# Altium footprint library Connectors.PcbLib: 131 footprints (part 1 of 9)
Each footprint in its own frame and in the unit in brackets; x right, y up, seen from the top. Pads: shape width x height; smd on the part's side, far side on the other; paste and mask are expansions set on the pad; w line width, h text height; cw(c..) or ccw(c..) is an arc to the next point about the centre after c.
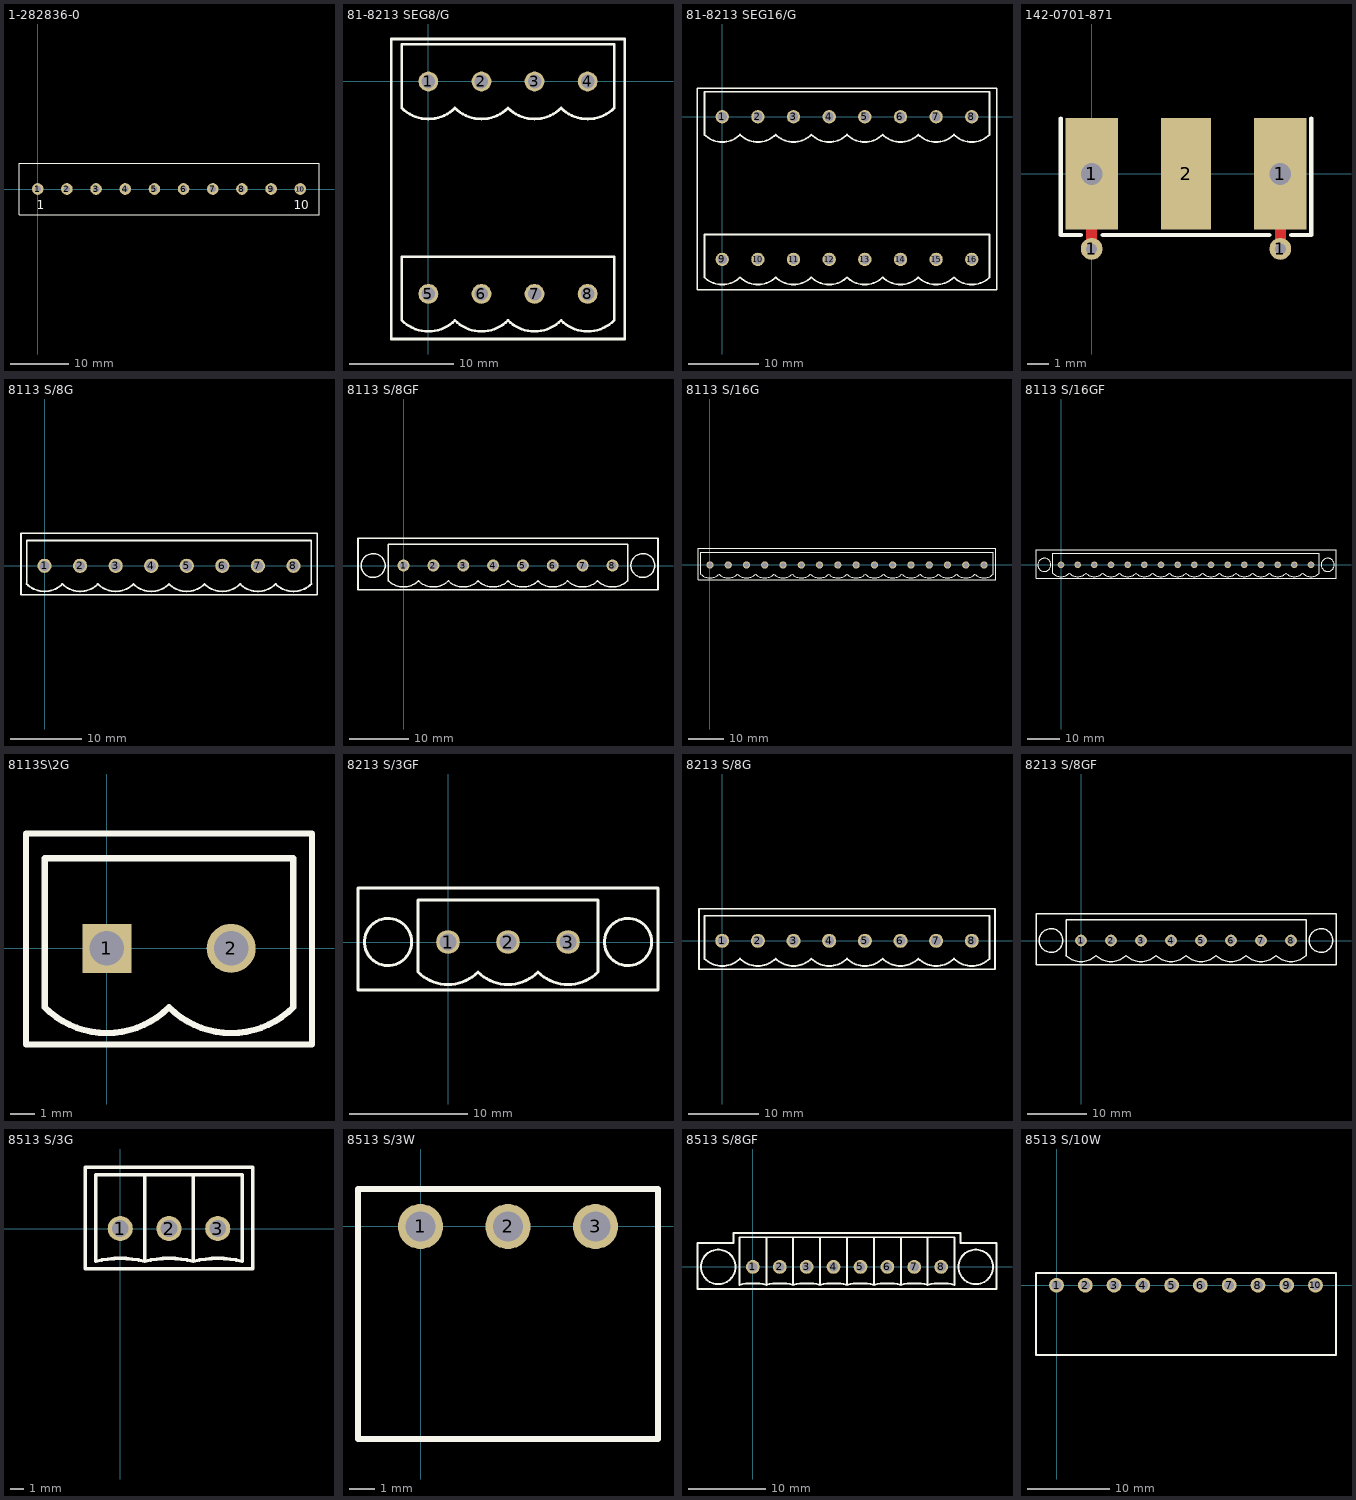
[diagram p0: the footprints below, top view; thin cyan lines are the x and y axes]

## 1-282836-0 [mm]
pads (10):
  round 2 hole 1.1: 1(0,0) 2(5,0) 3(10,0) 4(15,0) 5(20,0) 6(25,0) 7(30,0) 8(35,0) 9(40,0) 10(45,0)
Top Overlay:
  lines w0.2: -3.2,-4.4 -3.2,4.4 48.2,4.4 48.2,-4.4 -3.2,-4.4
  text "1" at -0.2,-3.5 h1.52
  text "10" at 43.9,-3.5 h1.52
Top Assembly:
  text ".Designator" at 27.498,-0.333 h1
3D body "c-1-282836-0-h-3d.stp": height 10, standoff -3.5, extent -3.1,-4.089 47.5,4.111

## 81-8213 SEG8/G [mm]
pads (8):
  round 1.9 hole 1.3: 1(0,0) 2(5.08,0) 3(10.16,0) 4(15.24,0) 5(0,-20.32) 6(5.08,-20.32) 7(10.16,-20.32) 8(15.24,-20.32)
Top Overlay:
  lines w0.254: -3.556,-24.638 -3.556,4.064 18.796,4.064 18.796,-24.638 -3.556,-24.638 ; -2.54,-22.86 ccw(c0,-20.32) 2.54,-22.86 ccw(c5.08,-20.32) 7.62,-22.86 ccw(c10.16,-20.32) 12.7,-22.86 ccw(c15.24,-20.32) 17.78,-22.86 17.78,-16.764 -2.54,-16.764 -2.54,-22.86 ; -2.54,-2.54 ccw(c0,0) 2.54,-2.54 ccw(c5.08,0) 7.62,-2.54 ccw(c10.16,0) 12.7,-2.54 ccw(c15.24,0) 17.78,-2.54 17.78,3.556 -2.54,3.556 -2.54,-2.54
Top Assembly:
  text ".Designator" at 12.618,-10.62 h1

## 81-8213 SEG16/G [mm]
pads (16):
  round 1.9 hole 1.3: 1(0,0) 2(5.08,0) 3(10.16,0) 4(15.24,0) 5(20.32,0) 6(25.4,0) 7(30.48,0) 8(35.56,0) 9(0,-20.32) 10(5.08,-20.32) 11(10.16,-20.32) 12(15.24,-20.32) 13(20.32,-20.32) 14(25.4,-20.32) 15(30.48,-20.32) 16(35.56,-20.32)
Top Overlay:
  lines w0.254: -3.556,-24.638 39.116,-24.638 39.116,4.064 -3.556,4.064 -3.556,-24.638 ; -2.54,-22.86 ccw(c0,-20.32) 2.54,-22.86 ccw(c5.08,-20.32) 7.62,-22.86 ccw(c10.16,-20.32) 12.7,-22.86 ccw(c15.24,-20.32) 17.78,-22.86 ccw(c20.32,-20.32) 22.86,-22.86 ccw(c25.4,-20.32) 27.94,-22.86 ccw(c30.48,-20.32) 33.02,-22.86 ccw(c35.56,-20.32) 38.1,-22.86 38.1,-16.764 -2.54,-16.764 -2.54,-22.86 ; -2.54,-2.54 ccw(c0,0) 2.54,-2.54 ccw(c5.08,0) 7.62,-2.54 ccw(c10.16,0) 12.7,-2.54 ccw(c15.24,0) 17.78,-2.54 ccw(c20.32,0) 22.86,-2.54 ccw(c25.4,0) 27.94,-2.54 ccw(c30.48,0) 33.02,-2.54 ccw(c35.56,0) 38.1,-2.54 38.1,3.556 -2.54,3.556 -2.54,-2.54
Top Assembly:
  text ".Designator" at 22.778,-10.62 h1

## 142-0701-871 [mm]
pads (5):
  round 1 hole 0.5: 1(0,-3.429) 1(8.636,-3.429)
  rect 2.4x5.1 / inner round 1.5 / far side rect 2.4x5.1 hole 1: 1(0,0) 1(8.636,0)
  rect 2.3x5.1 smd: 2(4.318,0)
Top Layer:
  lines w0.5: 0,-3.429 0,0 ; 8.636,-3.429 8.636,0
Top Overlay:
  lines w0.2: -1.422,2.54 -1.422,-2.794 -0.508,-2.794 ; 0.508,-2.794 8.128,-2.794 ; 9.144,-2.794 10.058,-2.794 10.058,2.54
Top Assembly:
  text ".Designator" at 9.316,5.545 h1
3D body "142-0701-871.STEP": height 5.16, standoff -4.36, extent -0.445,-1.676 9.08,15.786

## 8113 S/8G [mm]
pads (8):
  round 2 hole 1.4: 1(0,0) 2(5,0) 3(10,0) 4(15,0) 5(20,0) 6(25,0) 7(30,0) 8(35,0)
Top Overlay:
  lines w0.254: -2.54,-2.54 ccw(c0,0) 2.54,-2.54 ; -2.5,-2.5 -2.5,3.556 37.5,3.556 37.5,-2.54 ; 2.46,-2.54 ccw(c5,0) 7.54,-2.54 ; 7.46,-2.54 ccw(c10,0) 12.54,-2.54 ; 12.46,-2.54 ccw(c15,0) 17.54,-2.54 ; 17.46,-2.54 ccw(c20,0) 22.54,-2.54 ; 22.46,-2.54 ccw(c25,0) 27.54,-2.54 ; 27.46,-2.54 ccw(c30,0) 32.54,-2.54 ; 32.46,-2.54 ccw(c35,0) 37.54,-2.54 ; -3.302,-4.064 38.354,-4.064 38.354,4.572 -3.302,4.572 -3.302,-4.064
Top Assembly:
  text ".Designator" at 22.524,-0.079 h1

## 8113 S/8GF [mm]
pads (8):
  round 2 hole 1.4: 1(0,0) 2(5,0) 3(10,0) 4(15,0) 5(20,0) 6(25,0) 7(30,0) 8(35,0)
Top Overlay:
  circle w0.254: c40.08,0 r2
  circle w0.254: c-5.08,0 r2
  lines w0.254: 2.46,-2.54 ccw(c5,0) 7.54,-2.54 ; 2.54,-2.54 cw(c0,0) -2.54,-2.54 -2.54,3.556 37.54,3.556 37.54,-2.54 cw(c35,0) 32.46,-2.54 ; 7.46,-2.54 ccw(c10,0) 12.54,-2.54 ; 12.46,-2.54 ccw(c15,0) 17.54,-2.54 ; 17.46,-2.54 ccw(c20,0) 22.54,-2.54 ; 22.46,-2.54 ccw(c25,0) 27.54,-2.54 ; 27.46,-2.54 ccw(c30,0) 32.54,-2.54 ; -7.62,-4.064 42.62,-4.064 42.62,4.572 -7.62,4.572 -7.62,-4.064
Top Assembly:
  text ".Designator" at 22.712,-0.079 h1
3D body "Wieland_25.359.3853.0_CAD STEP data.STP": height 12.1, standoff -3.4, extent -7.625,-3.885 43.175,4.515

## 8113 S/16G [mm]
pads (16):
  round 2 hole 1.4: 1(0,0) 2(5.08,0) 3(10.16,0) 4(15.24,0) 5(20.32,0) 6(25.4,0) 7(30.48,0) 8(35.56,0) 9(40.64,0) 10(45.72,0) 11(50.8,0) 12(55.88,0) 13(60.96,0) 14(66.04,0) 15(71.12,0) 16(76.2,0)
Top Overlay:
  lines w0.254: -3.302,-4.064 -3.302,4.572 79.502,4.572 79.502,-4.064 -3.302,-4.064 ; -2.54,-2.54 ccw(c0,0) 2.54,-2.54 ccw(c5.08,0) 7.62,-2.54 ccw(c10.16,0) 12.7,-2.54 ccw(c15.24,0) 17.78,-2.54 ccw(c20.32,0) 22.86,-2.54 ccw(c25.4,0) 27.94,-2.54 ccw(c30.48,0) 33.02,-2.54 ccw(c35.56,0) 38.1,-2.54 ccw(c40.64,0) 43.18,-2.54 ccw(c45.72,0) 48.26,-2.54 ccw(c50.8,0) 53.34,-2.54 ccw(c55.88,0) 58.42,-2.54 ccw(c60.96,0) 63.5,-2.54 ccw(c66.04,0) 68.58,-2.54 ccw(c71.12,0) 73.66,-2.54 ccw(c76.2,0) 78.74,-2.54 78.74,3.556 -2.54,3.556 -2.54,-2.54
Top Assembly:
  text ".Designator" at 43.098,-0.079 h1

## 8113 S/16GF [mm]
pads (16):
  round 2 hole 1.4: 1(0,0) 2(5.08,0) 3(10.16,0) 4(15.24,0) 5(20.32,0) 6(25.4,0) 7(30.48,0) 8(35.56,0) 9(40.64,0) 10(45.72,0) 11(50.8,0) 12(55.88,0) 13(60.96,0) 14(66.04,0) 15(71.12,0) 16(76.2,0)
Top Overlay:
  circle w0.254: c81.28,0 r2
  circle w0.254: c-5.08,0 r2
  lines w0.254: -7.62,-4.064 83.82,-4.064 83.82,4.572 -7.62,4.572 -7.62,-4.064 ; -2.54,-2.54 ccw(c0,0) 2.54,-2.54 ccw(c5.08,0) 7.62,-2.54 ccw(c10.16,0) 12.7,-2.54 ccw(c15.24,0) 17.78,-2.54 ccw(c20.32,0) 22.86,-2.54 ccw(c25.4,0) 27.94,-2.54 ccw(c30.48,0) 33.02,-2.54 ccw(c35.56,0) 38.1,-2.54 ccw(c40.64,0) 43.18,-2.54 ccw(c45.72,0) 48.26,-2.54 ccw(c50.8,0) 53.34,-2.54 ccw(c55.88,0) 58.42,-2.54 ccw(c60.96,0) 63.5,-2.54 ccw(c66.04,0) 68.58,-2.54 ccw(c71.12,0) 73.66,-2.54 ccw(c76.2,0) 78.74,-2.54 78.74,3.556 -2.54,3.556 -2.54,-2.54
Top Assembly:
  text ".Designator" at 43.098,-0.079 h1

## 8113S\2G [mm]
pads (2):
  rect 2x2 hole 1.4: 1(0,0)
  round 2 hole 1.4: 2(5.08,0)
Top Overlay:
  lines w0.254: -3.302,-3.937 -3.302,4.699 8.382,4.699 8.382,-3.937 -3.302,-3.937 ; -2.54,-2.413 ccw(c0,0.127) 2.54,-2.413 ccw(c5.08,0.127) 7.62,-2.413 7.62,3.683 -2.54,3.683 -2.54,-2.413
Top Assembly:
  text ".Designator" at 7.538,0.048 h1
3D body "Wieland_25.350.3253.0_CAD STEP data.STP": height 12.02, standoff -3.48, extent -3.24,-3.915 8.32,4.485

## 8213 S/3GF [mm]
pads (3):
  round 2 hole 1.4: 1(0,0) 2(5.08,0) 3(10.16,0)
Top Overlay:
  circle w0.254: c-5.08,0 r2
  circle w0.254: c15.24,0 r2
  lines w0.254: -7.62,-4.064 -7.62,4.572 17.78,4.572 17.78,-4.064 -7.62,-4.064 ; -2.54,-2.54 ccw(c0,0) 2.54,-2.54 ccw(c5.08,0) 7.62,-2.54 ccw(c10.16,0) 12.7,-2.54 12.7,3.556 -2.54,3.556 -2.54,-2.54
Top Assembly:
  text ".Designator" at 10.078,-0.079 h1

## 8213 S/8G [mm]
pads (8):
  round 2 hole 1.4: 1(0,0) 2(5.08,0) 3(10.16,0) 4(15.24,0) 5(20.32,0) 6(25.4,0) 7(30.48,0) 8(35.56,0)
Top Overlay:
  lines w0.254: -3.302,-4.064 38.862,-4.064 38.862,4.572 -3.302,4.572 -3.302,-4.064 ; -2.54,-2.54 ccw(c0,0) 2.54,-2.54 ccw(c5.08,0) 7.62,-2.54 ccw(c10.16,0) 12.7,-2.54 ccw(c15.24,0) 17.78,-2.54 ccw(c20.32,0) 22.86,-2.54 ccw(c25.4,0) 27.94,-2.54 ccw(c30.48,0) 33.02,-2.54 ccw(c35.56,0) 38.1,-2.54 38.1,3.556 -2.54,3.556 -2.54,-2.54
Top Assembly:
  text ".Designator" at 22.643,-0.079 h1
3D body "c-796636-8-b-3d.stp": height 12.03, standoff -3.47, extent -3.7,-3.86 38.76,4.49

## 8213 S/8GF [mm]
pads (8):
  round 2 hole 1.4: 1(0,0) 2(5.08,0) 3(10.16,0) 4(15.24,0) 5(20.32,0) 6(25.4,0) 7(30.48,0) 8(35.56,0)
Top Overlay:
  circle w0.254: c-5.08,0 r2
  circle w0.254: c40.64,0 r2
  lines w0.254: -7.62,-4.064 -7.62,4.572 43.18,4.572 43.18,-4.064 -7.62,-4.064 ; -2.54,-2.54 ccw(c0,0) 2.54,-2.54 ccw(c5.08,0) 7.62,-2.54 ccw(c10.16,0) 12.7,-2.54 ccw(c15.24,0) 17.78,-2.54 ccw(c20.32,0) 22.86,-2.54 ccw(c25.4,0) 27.94,-2.54 ccw(c30.48,0) 33.02,-2.54 ccw(c35.56,0) 38.1,-2.54 38.1,3.556 -2.54,3.556 -2.54,-2.54
Top Assembly:
  text ".Designator" at 22.778,-0.079 h1
3D body "c-796636-8-b-3d.stp": height 12.03, standoff -3.47, extent -3.705,-3.855 38.755,4.495

## 8513 S/3G [mm]
pads (3):
  round 1.8 hole 1.2: 1(0,0) 2(3.5,0) 3(7,0)
Top Overlay:
  lines w0.254: -1.75,-2.35 -1.75,3.85 8.75,3.85 8.75,-2.35 ; -1.745,-2.349 cw(c0,-9.4) 1.745,-2.349 ; 1.75,-2.35 1.75,3.85 ; 1.755,-2.349 cw(c3.5,-9.4) 5.245,-2.349 ; 5.25,-2.35 5.25,3.85 ; 5.255,-2.349 cw(c7,-9.4) 8.745,-2.349 ; -2.5,-2.9 9.5,-2.9 9.5,4.4 -2.5,4.4 -2.5,-2.9
Top Assembly:
  text ".Designator" at 8.498,0.417 h1

## 8513 S/3W [mm]
pads (3):
  round 1.8 hole 1.2: 1(0,0) 2(3.5,0) 3(7,0)
Top Overlay:
  lines w0.254: -2.5,-8.5 -2.5,1.5 9.5,1.5 9.5,-8.5 -2.5,-8.5
Top Assembly:
  text ".Designator" at 8.498,-3.833 h1

## 8513 S/8GF [mm]
pads (8):
  round 1.8 hole 1.2: 1(0,0) 2(3.5,0) 3(7,0) 4(10.5,0) 5(14,0) 6(17.5,0) 7(21,0) 8(24.5,0)
Top Overlay:
  circle w0.254: c29,0 r2.25
  circle w0.254: c-4.5,0 r2.25
  lines w0.254: -1.75,-2.35 -1.75,3.85 26.25,3.85 ; -1.745,-2.349 cw(c0,-9.4) 1.745,-2.349 ; 1.75,-2.35 1.75,3.85 ; 1.755,-2.349 cw(c3.5,-9.4) 5.245,-2.349 ; 5.25,-2.35 5.25,3.85 ; 5.255,-2.349 cw(c7,-9.4) 8.745,-2.349 ; 8.75,-2.35 8.75,3.85 ; 8.755,-2.349 cw(c10.5,-9.4) 12.245,-2.349 ; 12.25,-2.35 12.25,3.85 ; 12.255,-2.349 cw(c14,-9.4) 15.745,-2.349 ; 15.75,-2.35 15.75,3.85 ; 15.755,-2.349 cw(c17.5,-9.4) 19.245,-2.349 ; 19.25,-2.35 19.25,3.85 ; 19.255,-2.349 cw(c21,-9.4) 22.745,-2.349 ; 22.75,-2.35 22.75,3.85 ; 22.755,-2.349 cw(c24.5,-9.4) 26.245,-2.349 ; 26.25,3.85 26.25,-2.35 26.25,3.85 ; -7.2,-2.9 -7.2,3.1 -2.5,3.1 -2.5,4.4 27,4.4 27,3.1 31.7,3.1 31.7,-2.9 -7.2,-2.9
Top Assembly:
  text ".Designator" at 17.248,0.417 h1
3D body "Wieland_25.646.3853.0_CAD STEP data.STP": height 9.3, standoff -3.4, extent -6.945,-2.905 31.455,4.245

## 8513 S/10W [mm]
pads (10):
  round 1.8 hole 1.2: 1(0,0) 2(3.5,0) 3(7,0) 4(10.5,0) 5(14,0) 6(17.5,0) 7(21,0) 8(24.5,0) 9(28,0) 10(31.5,0)
Top Overlay:
  lines w0.254: -2.5,-8.5 34,-8.5 34,1.5 -2.5,1.5 -2.5,-8.5
Top Assembly:
  text ".Designator" at 20.748,-3.833 h1